# Altium footprint library TarabusLib_KOR.PcbLib: 560 footprints (part 12 of 35)
Each footprint in its own frame and in the unit in brackets; x right, y up, seen from the top. Pads: shape width x height; smd on the part's side, far side on the other; paste and mask are expansions set on the pad; w line width, h text height; cw(c..) or ccw(c..) is an arc to the next point about the centre after c.
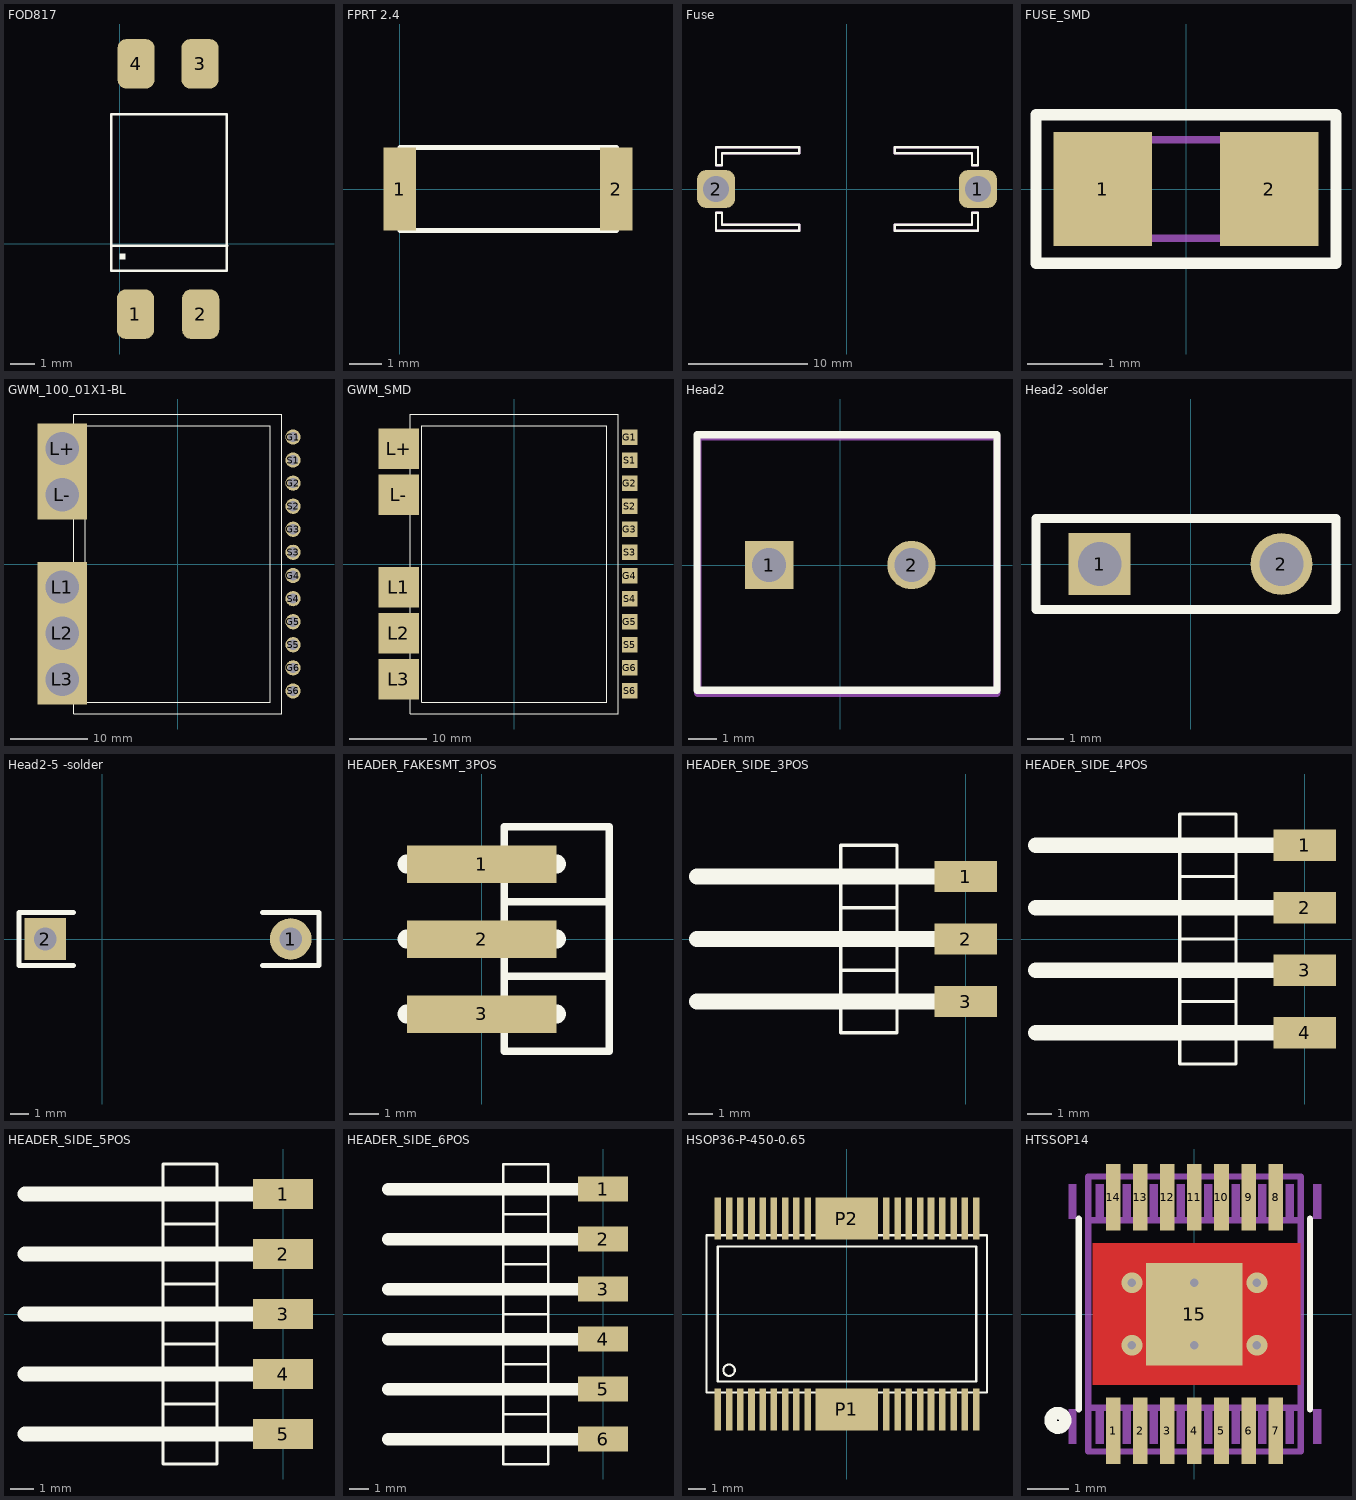
[diagram p11: the footprints below, top view; thin cyan lines are the x and y axes]

## FOD817 [mm]
pads (4):
  rrect50% 1.5x2 smd: 1(0.625,-2.825) 2(3.25,-2.825) 3(3.225,7.25) 4(0.65,7.25)
Top Overlay:
  rectangle: -0.025,-0.625 0.225,-0.375
  lines w0.1: -0.35,-0.075 4.325,-0.075 ; -0.35,-1.075 4.3,-1.075 4.3,5.225 -0.35,5.225 -0.35,-1.075
3D body "User Library-FOD817.step": height 4.8, standoff 0.2, extent -0.625,-3.025 4.475,7.435

## FPRT 2.4 [mm]
pads (2):
  rect 1x2.54 smd mask+0: 1(0,0) 2(6.6,0)
Top Overlay:
  lines w0.15: 0.01,-1.27 6.61,-1.27 6.61,1.27 0.01,1.27 0.01,-1.27
3D body: height 1.7, standoff 0, extent 0.01,-1.27 6.6,1.27

## Fuse [mm] "Fuse; 2 Leads"
pads (2):
  rrect50% 3.2x3.2 hole 2.2: 1(11,0) 2(-11,0)
Top Overlay:
  lines w0.2: -11,-3.5 -4,-3.5 -4,-3 -10.5,-3 -10.5,-2 -11,-2 -11,-3.5 ; -11,2 -10.5,2 -10.5,3 -4,3 -4,3.5 -11,3.5 -11,2 ; 4,-3.5 11,-3.5 11,-2 10.5,-2 10.5,-3 4,-3 4,-3.5 ; 4,3 10.5,3 10.5,2 11,2 11,3.5 4,3.5 4,3
Mechanical 7:
  lines w0.2: -11,-3.5 -11,-2 -10.5,-2 -10.5,-3 -4,-3 -4,-3.5 -11,-3.5 ; -11,2 -11,3.5 -4,3.5 -4,3 -10.5,3 -10.5,2 -11,2 ; 4,-3.5 4,-3 10.5,-3 10.5,-2 11,-2 11,-3.5 4,-3.5 ; 4,3 4,3.5 11,3.5 11,2 10.5,2 10.5,3 4,3
Mechanical 10:
  text ".Designator" at 6.65,5.4 h0.8
  text ".Comment" at 7,4.5 h0.6

## FUSE_SMD [mm]
height 0.5
pads (2):
  rect 1.3x1.5 smd: 1(-1.1,0) 2(1.1,0)
Top Overlay:
  lines w0.15: -1.98,-0.98 1.98,-0.98 1.98,0.98 -1.98,0.98 -1.98,-0.98
Mechanical 10:
  text ".Comment" at -0.64,-1.56 h0.6
  text ".Designator" at -0.47,1.37 h0.8
Mechanical 11:
  lines w0.1: -1.05,-0.65 1.05,-0.65 1.05,0.65 -1.05,0.65 -1.05,-0.65
3D body "Features-6.step": height 0.5, standoff -0.05, extent -1.525,-0.775 1.575,0.825

## GWM_100_01X1-BL [mil]
pads (17):
  round 78 hole 52: G1(591,650) G2(591,414) G3(591,178) G4(591,-59.06) G5(591,-295.28) G6(591,-531.5) S1(591,532) S2(591,296) S3(591,60) S4(591,-177.17) S5(591,-413.39) S6(591,-649.61)
  rect 255x255 hole 170: L1(-590.55,-118.11) L2(-590.55,-354.33) L3(-590.55,-590.55) L+(-590.55,591) L-(-590.55,355)
Top Overlay:
  lines w5: -531.5,-767.72 -531.5,768 532,768 532,-767.72 -531.5,-767.72 ; -472.44,-708.66 473,-708.66 473,709 -472.44,709 -472.44,-708.66

## GWM_SMD [mil]
pads (17):
  rect 79x79 smd: G1(591,650) G2(591,414) G3(591,178) G4(591,-59.06) G5(591,-295.28) G6(591,-531.5) S1(591,532) S2(591,296) S3(591,60) S4(591,-177.17) S5(591,-413.39) S6(591,-649.61)
  rect 207x207 smd: L1(-590.55,-118.11) L2(-590.55,-354.33) L3(-590.55,-590.55) L+(-590.55,591) L-(-590.55,355)
Top Overlay:
  lines w5: -531.5,-767.72 -531.5,768 532,768 532,-767.72 -531.5,-767.72 ; -472.44,-708.66 473,-708.66 473,709 -472.44,709 -472.44,-708.66

## Head2 [mm]
pads (2):
  rect 1.7x1.7 hole 1.2: 1(-2.5,0)
  round 1.7 hole 1.2: 2(2.5,0)
Top Overlay:
  lines w0.254: -5.029,-4.394 -5.029,4.572 5.5,4.572 5.5,-4.394 -5.029,-4.394
Mechanical 9:
  text ".Comment" at -0.84,-3 h0.6
  text ".Designator" at -1.15,3.27 h0.8
Mechanical 11:
  lines w0.254: -5,-4.5 -5,4.5 5.5,4.5 5.5,-4.5 -5,-4.5
3D body "Клеммник DT128V.STEP": height 15.2, standoff -3.5, extent -4.996,-4.377 5.504,4.623

## Head2 -solder [mm]
pads (2):
  rect 1.7x1.7 hole 1.2: 1(-2.5,0)
  round 1.7 hole 1.2: 2(2.5,0)
Top Overlay:
  lines w0.254: -4.25,-1.25 4,-1.25 4,1.25 -4.25,1.25 -4.25,-1.25

## Head2-5 -solder [mm]
pads (2):
  round 2.2 hole 1.2: 1(10,0)
  rect 2.2x2.2 hole 1.2: 2(-3,0)
Top Overlay:
  lines w0.254: -1.5,-1.4 -4.4,-1.4 -4.4,1.4 -1.5,1.4 ; 8.5,-1.4 11.5,-1.4 11.5,1.4 8.5,1.4

## HEADER_FAKESMT_3POS [mm]
pads (3):
  rect 5.08x1.27 smd: 1(0,2.54) 2(0,0) 3(0,-2.54)
Top Overlay:
  lines w0.254: 0.762,-1.27 4.318,-1.27 ; 0.762,-1.27 0.762,1.27 ; 0.762,-1.27 0.762,-3.81 4.318,-3.81 4.318,-1.27 ; 0.762,1.27 4.318,1.27 ; 0.762,1.27 0.762,3.81 4.318,3.81 4.318,1.27 ; 4.318,-1.27 4.318,1.27
  lines w0.635: -2.54,-2.54 2.54,-2.54 ; -2.54,0 2.54,0 ; -2.54,2.54 2.54,2.54

## HEADER_SIDE_3POS [mm]
pads (3):
  rect 2.54x1.27 smd: 1(0,2.54) 2(0,0) 3(0,-2.54)
Top Overlay:
  lines w0.127: -5.08,-1.27 -2.794,-1.27 ; -5.08,-1.27 -5.08,-3.81 -2.794,-3.81 -2.794,-1.27 ; -5.08,-1.27 -5.08,1.27 ; -5.08,1.27 -2.794,1.27 ; -5.08,1.27 -5.08,3.81 -2.794,3.81 -2.794,1.27 ; -2.794,-1.27 -2.794,1.27
  lines w0.635: -10.922,-2.54 -0.508,-2.54 ; -10.922,0 -0.508,0 ; -10.922,2.54 -0.508,2.54

## HEADER_SIDE_4POS [mm]
pads (4):
  rect 2.54x1.27 smd: 1(0,3.81) 2(0,1.27) 3(0,-1.27) 4(0,-3.81)
Top Overlay:
  lines w0.127: -2.794,-2.54 -5.08,-2.54 ; -5.08,-2.54 -5.08,-5.08 -2.794,-5.08 -2.794,0 ; -5.08,-2.54 -5.08,0 ; -5.08,0 -2.794,0 ; -5.08,0 -5.08,2.54 ; -5.08,2.54 -2.794,2.54 ; -5.08,2.54 -5.08,5.08 -2.794,5.08 -2.794,2.54 ; -2.794,0 -2.794,2.54
  lines w0.635: -10.922,-3.81 -0.508,-3.81 ; -10.922,-1.27 -0.508,-1.27 ; -10.922,1.27 -0.508,1.27 ; -10.922,3.81 -0.508,3.81

## HEADER_SIDE_5POS [mm]
pads (5):
  rect 2.54x1.27 smd: 1(0,5.08) 2(0,2.54) 3(0,0) 4(0,-2.54) 5(0,-5.08)
Top Overlay:
  lines w0.127: -2.794,-3.81 -5.08,-3.81 ; -2.794,-1.27 -5.08,-1.27 ; -5.08,-3.81 -5.08,-6.35 -2.794,-6.35 -2.794,1.27 ; -5.08,-3.81 -5.08,-1.27 ; -5.08,-1.27 -5.08,1.27 ; -5.08,1.27 -2.794,1.27 ; -5.08,1.27 -5.08,3.81 ; -5.08,3.81 -2.794,3.81 ; -5.08,3.81 -5.08,6.35 -2.794,6.35 -2.794,3.81 ; -2.794,1.27 -2.794,3.81
  lines w0.635: -10.922,-5.08 -0.508,-5.08 ; -10.922,-2.54 -0.508,-2.54 ; -10.922,0 -0.508,0 ; -10.922,2.54 -0.508,2.54 ; -10.922,5.08 -0.508,5.08

## HEADER_SIDE_6POS [mm]
pads (6):
  rect 2.54x1.27 smd: 1(0,6.35) 2(0,3.81) 3(0,1.27) 4(0,-1.27) 5(0,-3.81) 6(0,-6.35)
Top Overlay:
  lines w0.127: -5.08,-5.08 -5.08,-2.54 ; -5.08,-5.08 -5.08,-7.62 -2.794,-7.62 -2.794,-5.08 ; -5.08,-5.08 -2.794,-5.08 ; -5.08,-2.54 -5.08,0 ; -5.08,-2.54 -2.794,-2.54 ; -5.08,0 -5.08,2.54 ; -5.08,0 -2.794,0 ; -5.08,0 -2.794,0 ; -5.08,2.54 -5.08,5.08 ; -5.08,2.54 -2.794,2.54 ; -5.08,5.08 -5.08,7.62 -2.794,7.62 -2.794,5.08 ; -5.08,5.08 -2.794,5.08 ; -2.794,-5.08 -2.794,-2.54 ; -2.794,-2.54 -2.794,0 ; -2.794,0 -2.794,2.54 ; -2.794,2.54 -2.794,5.08
  lines w0.635: -10.922,-6.35 -0.508,-6.35 ; -10.922,-3.81 -0.508,-3.81 ; -10.922,-1.27 -0.508,-1.27 ; -10.922,1.27 -0.508,1.27 ; -10.922,3.81 -0.508,3.81 ; -10.922,6.35 -0.508,6.35

## HSOP36-P-450-0.65 [mil]
pads (38):
  rect 15x95 smd: 1(-294.29,-217.52) 2(-268.7,-217.52) 3(-243.11,-217.52) 4(-217.52,-217.52) 5(-191.93,-217.52) 6(-166.34,-217.52) 7(-140.75,-217.52) 8(-115.16,-217.52) 9(-89.57,-217.52) 10(90,-217.52) 11(116,-217.52) 12(141,-217.52) 13(167,-217.52) 14(192,-217.52) 15(218,-217.52) 16(244,-217.52) 17(269,-217.52) 18(295,-217.52) 19(295,218) 20(269,218) 21(244,218) 22(218,218) 23(192,218) 24(167,218) 25(141,218) 26(116,218) 27(90,218) 28(-89.57,218) 29(-115.16,218) 30(-140.75,218) 31(-166.34,218) 32(-191.93,218) 33(-217.52,218) 34(-243.11,218) 35(-268.7,218) 36(-294.29,218)
  rect 142x95 smd: P1(0,-217.52) P2(0,218)
Top Overlay:
  circle w5: c-268.7,-127.95 r13
  lines w5: -319.88,-179.13 -319.88,180 320,180 320,-179.13 -319.88,-179.13 ; -294.29,-153.54 -294.29,154 295,154 295,-153.54 -294.29,-153.54

## HTSSOP14 [mm]
height 1.1
pads (15):
  rect 0.35x1.6 smd mask+0.075: 1(-1.95,-2.8) 2(-1.3,-2.8) 3(-0.65,-2.8) 4(0,-2.8) 5(0.65,-2.8) 6(1.3,-2.8) 7(1.95,-2.8) 8(1.95,2.8) 9(1.3,2.8) 10(0.65,2.8) 11(0,2.8) 12(-0.65,2.8) 13(-1.3,2.8) 14(-1.95,2.8)
  rect 2.31x2.46 smd mask+0.075: 15(0,-0.002)
via 0,0.75 diameter 0.5 hole 0.2
via 0,-0.75 diameter 0.5 hole 0.2
via 1.5,-0.75 diameter 0.5 hole 0.2
via 1.5,0.75 diameter 0.5 hole 0.2
via -1.5,-0.75 diameter 0.5 hole 0.2
via -1.5,0.75 diameter 0.5 hole 0.2
Top Layer:
  rectangle: -2.45,-1.7 2.55,1.7
Top Overlay:
  circle w0.3: c-3.275,-2.552 r0.175
  lines w0.152: -2.775,-2.284 -2.775,2.284 ; 2.775,-2.284 2.775,2.284
Mechanical 7:
  lines w0.152: -2.55,-2.25 2.55,-2.25 ; -2.55,2.25 2.55,2.25 ; -2.55,-3.3 -2.55,3.3 2.55,3.3 2.55,-3.3 -2.55,-3.3
Mechanical 10:
  text ".Comment" at -1.7,4.45 h1.52
  text ".Designator" at -1.85,-5.225 h1.52
Mechanical 16:
  rectangle: -3.027,2.284 -2.823,3.123
  rectangle: -2.377,2.284 -2.173,3.123
  rectangle: -1.727,2.284 -1.523,3.123
  rectangle: -1.077,2.284 -0.873,3.123
  rectangle: -0.427,2.284 -0.223,3.123
  rectangle: 0.229,2.284 0.432,3.123
  rectangle: 0.889,2.284 1.092,3.123
  rectangle: 1.524,2.284 1.727,3.123
  rectangle: 2.184,2.284 2.388,3.123
  rectangle: 2.845,2.284 3.048,3.123
  rectangle: 2.845,-3.123 3.048,-2.284
  rectangle: 2.184,-3.123 2.388,-2.284
  rectangle: 1.524,-3.123 1.727,-2.284
  rectangle: 0.889,-3.123 1.092,-2.284
  rectangle: 0.229,-3.123 0.432,-2.284
  rectangle: -0.427,-3.123 -0.223,-2.284
  rectangle: -1.077,-3.123 -0.873,-2.284
  rectangle: -1.727,-3.123 -1.523,-2.284
  rectangle: -2.377,-3.123 -2.173,-2.284
  rectangle: -3.027,-3.123 -2.823,-2.284
3D body: height 1.1, standoff 0.05, extent -2.55,-2.25 2.55,2.25
3D body: height 0.5, standoff 0.05, extent -2.55,2.2 2.55,3.3
3D body: height 0.5, standoff 0.05, extent -2.55,-3.3 2.55,-2.2